# Altium footprint library 常用元件封裝庫(pcb).PCBLIB: 399 footprints (part 13 of 25)
Each footprint in its own frame and in the unit in brackets; x right, y up, seen from the top. Pads: shape width x height; smd on the part's side, far side on the other; paste and mask are expansions set on the pad; w line width, h text height; cw(c..) or ccw(c..) is an arc to the next point about the centre after c.
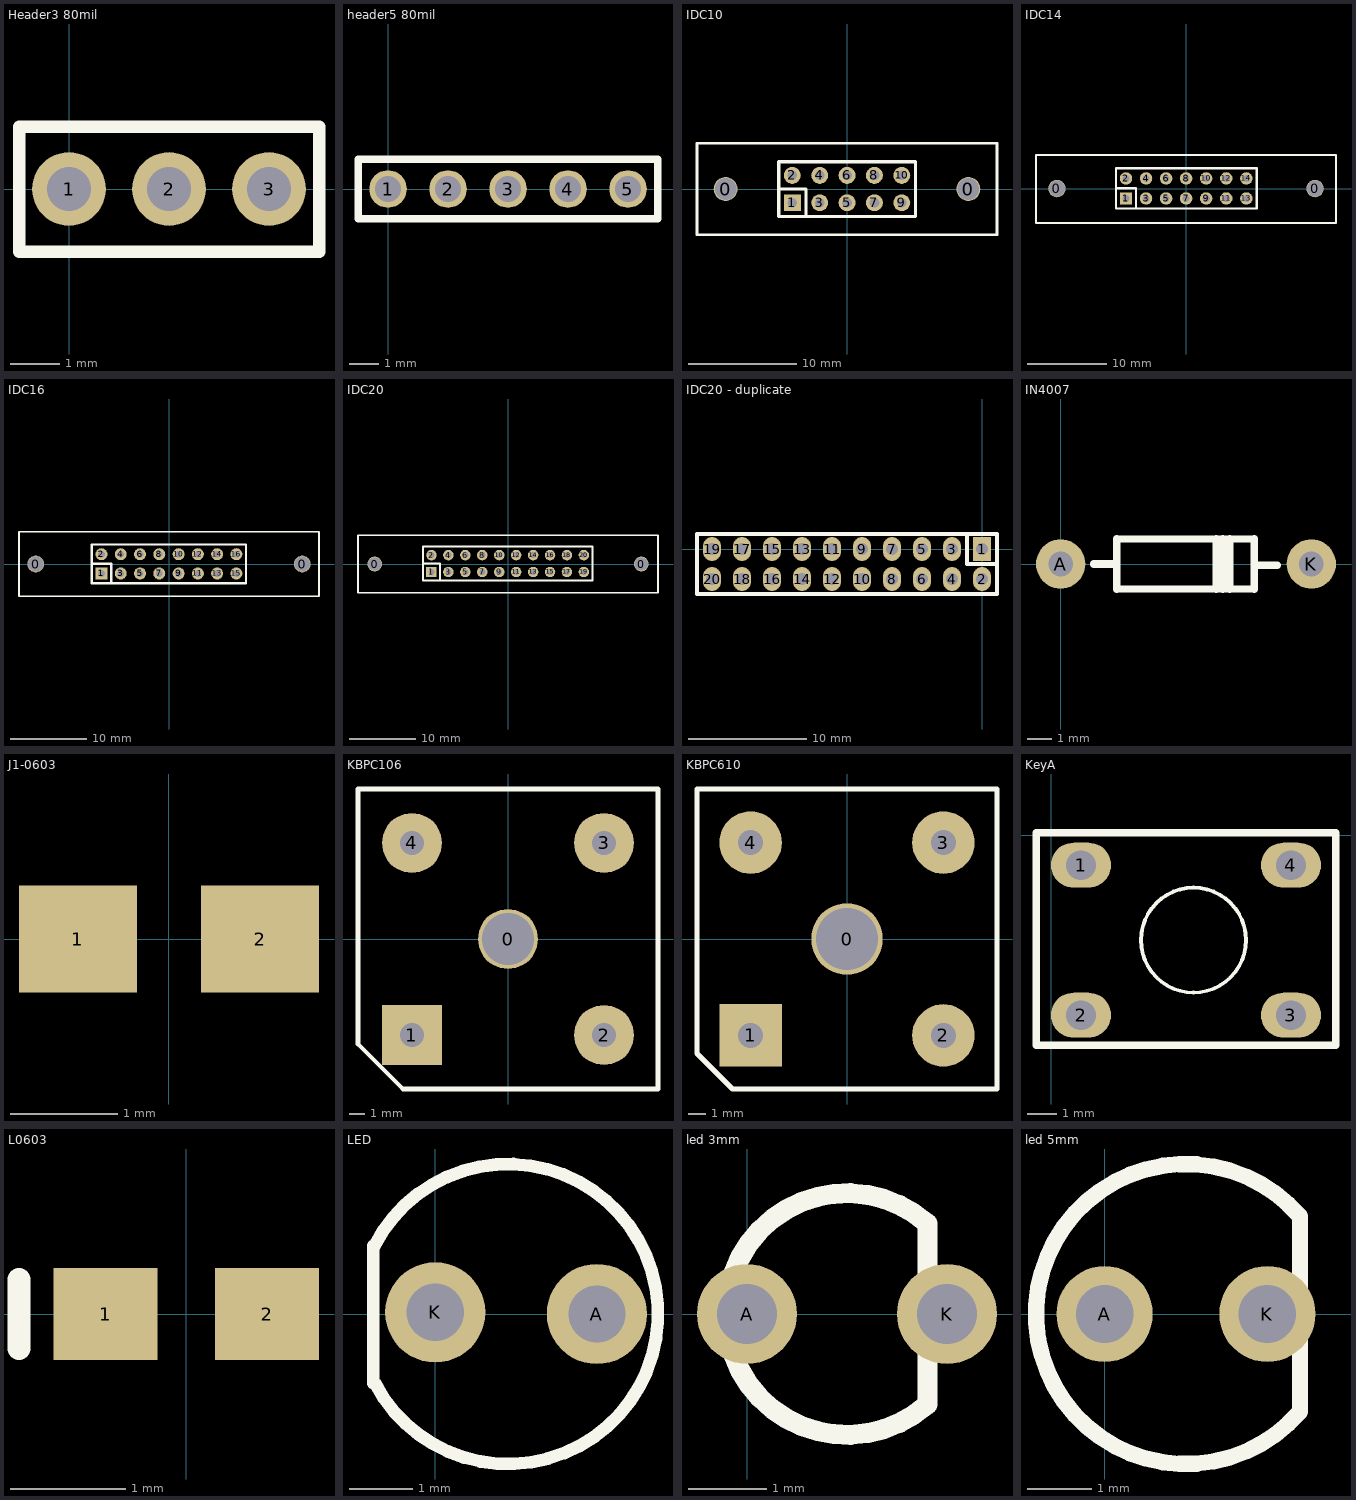
[diagram p12: the footprints below, top view; thin cyan lines are the x and y axes]

## Header3 80mil [mm]
pads (3):
  round 1.5 hole 0.9: 1(0,0) 2(2.032,0) 3(4.064,0)
Top Overlay:
  lines w0.254: -1.016,-1.27 -1.016,1.27 5.08,1.27 5.08,-1.27 -1.016,-1.27

## header5 80mil [mil]
pads (5):
  round 50 hole 35: 1(0,0) 2(80,0) 3(160,0) 4(240,0) 5(320,0)
Top Overlay:
  lines w10: -40,-40 360,-40 360,40 -40,40 -40,-40

## IDC10 [mm]
pads (12):
  round 2.2 hole 2: 0(-11.27,0) 0(11.27,0)
  rect 1.575x1.575 hole 0.9: 1(-5.075,-1.275)
  round 1.575 hole 0.9: 2(-5.075,1.265) 3(-2.535,-1.275) 4(-2.535,1.265) 5(0.005,-1.275) 6(0.005,1.265) 7(2.545,-1.275) 8(2.545,1.265) 9(5.085,-1.275) 10(5.085,1.265)
Top Overlay:
  lines w0.254: -13.92,-4.25 13.92,-4.25 13.92,4.25 -13.92,4.25 -13.92,-4.25
  lines w0.305: -6.345,-0.005 -3.805,-0.005 -3.805,-2.545 ; -6.345,-2.545 -6.345,2.535 6.355,2.535 6.355,-2.545 -6.345,-2.545

## IDC14 [mm]
pads (16):
  round 2.2 hole 2: 0(-16.35,0) 0(16.35,0)
  rect 1.575x1.575 hole 0.9: 1(-7.601,-1.25)
  round 1.575 hole 0.9: 2(-7.601,1.29) 3(-5.061,-1.25) 4(-5.061,1.29) 5(-2.521,-1.25) 6(-2.521,1.29) 7(0.019,-1.25) 8(0.019,1.29) 9(2.559,-1.25) 10(2.559,1.29) 11(5.099,-1.25) 12(5.099,1.29) 13(7.639,-1.25) 14(7.639,1.29)
Top Overlay:
  lines w0.254: -19,-4.35 -19,4.25 19,4.25 19,-4.35 -19,-4.35
  lines w0.305: -8.871,0.02 -6.331,0.02 -6.331,-2.52 ; 8.979,-2.52 8.979,2.56 ; 8.983,-2.515 -8.871,-2.52 -8.871,2.56 8.983,2.57

## IDC16 [mm]
pads (18):
  round 2.2 hole 2: 0(-17.57,0) 0(17.57,0)
  rect 1.575x1.575 hole 0.9: 1(-8.9,-1.25)
  round 1.575 hole 0.9: 2(-8.9,1.29) 3(-6.36,-1.25) 4(-6.36,1.29) 5(-3.82,-1.25) 6(-3.82,1.29) 7(-1.28,-1.25) 8(-1.28,1.29) 9(1.26,-1.25) 10(1.26,1.29) 11(3.8,-1.25) 12(3.8,1.29) 13(6.34,-1.25) 14(6.34,1.29) 15(8.88,-1.25) 16(8.88,1.29)
Top Overlay:
  lines w0.254: 19.765,-4.25 19.765,4.25 ; 19.77,-4.25 -19.77,-4.25 -19.77,4.25 19.77,4.25
  lines w0.305: -10.17,0.02 -7.63,0.02 -7.63,-2.52 ; -10.17,-2.52 -10.17,2.56 10.15,2.56 10.15,-2.52 -10.17,-2.52

## IDC20 [mm]
pads (22):
  round 2.2 hole 2: 0(-20,0) 0(20,0)
  rect 1.575x1.575 hole 0.9: 1(-11.476,-1.2)
  round 1.575 hole 0.9: 2(-11.476,1.34) 3(-8.936,-1.2) 4(-8.936,1.34) 5(-6.396,-1.2) 6(-6.396,1.34) 7(-3.856,-1.2) 8(-3.856,1.34) 9(-1.316,-1.2) 10(-1.316,1.34) 11(1.224,-1.2) 12(1.224,1.34) 13(3.764,-1.2) 14(3.764,1.34) 15(6.304,-1.2) 16(6.304,1.34) 17(8.844,-1.2) 18(8.844,1.34) 19(11.384,-1.2) 20(11.384,1.34)
Top Overlay:
  lines w0.254: -22.5,-4.3 -22.5,4.3 22.5,4.3 22.5,-4.3 -22.5,-4.3
  lines w0.305: -12.746,0.07 -10.206,0.07 -10.206,-2.47 ; -12.746,-2.47 12.654,-2.47 12.654,2.61 -12.746,2.61 -12.746,-2.47

## IDC20 - duplicate [mil]
pads (20):
  rect 60x80 hole 40: 1(0,0)
  oval 60x80 hole 40: 2(0,-100) 3(-100,0) 4(-100,-100) 5(-200,0) 6(-200,-100) 7(-300,0) 8(-300,-100) 9(-400,0) 10(-400,-100) 11(-500,0) 12(-500,-100) 13(-600,0) 14(-600,-100) 15(-700,0) 16(-700,-100) 17(-800,0) 18(-800,-100) 19(-900,0) 20(-900,-100)
Top Overlay:
  lines w12: -50,50 -50,-50 50,-50 ; -950,-150 50,-150 50,50 -950,50 -950,-150

## IN4007 [mm]
pads (2):
  round 2 hole 1: A(0,0) K(10.16,0)
Top Overlay:
  lines w0.305: 1.35,0 2.282,0 ; 2.282,-1.016 2.282,1.016 ; 2.289,-1.007 7.841,-1.014 ; 2.289,1.007 7.841,1.014 ; 6.3,-1.016 6.3,1.016 ; 6.575,-1.016 6.575,1.016 ; 6.85,-1.016 6.85,1.016 ; 7.853,-1.016 7.853,1.016 ; 7.853,-0.05 8.785,-0.05

## J1-0603 [mm] "Chip Resistor; Body 1.6 x 0.8 mm (LxW typ)"
height 0.6
pads (2):
  rect 1.1x1 smd: 1(-0.85,0) 2(0.85,0)

## KBPC106 [mm]
pads (5):
  round 4 hole 3.5: 0(0,0)
  rect 4x4 hole 1.6: 1(-6.4,-6.4)
  round 4 hole 1.6: 2(6.4,-6.4) 3(6.4,6.4) 4(-6.4,6.4)
Top Overlay:
  lines w0.305: -10,-7 -10,10 10,10 10,-10 -7,-10 -10,-7

## KBPC610 [mm]
pads (5):
  round 4 hole 3.5: 0(0,0)
  rect 3.5x3.5 hole 1.4: 1(-5.4,-5.4)
  round 3.5 hole 1.4: 2(5.4,-5.4) 3(5.4,5.4) 4(-5.4,5.4)
Top Overlay:
  lines w0.305: -8.4,-6.4 -6.4,-8.4 8.4,-8.4 8.4,8.4 -8.4,8.4 -8.4,-6.4

## KeyA [mil]
pads (4):
  oval 80x60 hole 39.37: 1(40,-40) 2(40,-240) 3(320,-240) 4(320,-40)
Top Overlay:
  circle w5: c190,-140 r70
  lines w10: -20,-280 140,-280 380,-280 380,-240 380,2.99 371.02,2.99 8.82,2.99 -20,2.99 -20,0 -20,-240 -20,-280

## L0603 [mm] "Chip Inductor; Body 1.6 x 0.8 mm (LxW typ)"
height 0.55
pads (2):
  rect 0.9x0.8 smd: 1(-0.7,0) 2(0.7,0)
Top Overlay:
  lines w0.2: -1.45,-0.3 -1.45,0.3

## LED [mil]
pads (2):
  round 62 hole 35.43: A(100,0) K(0,1)
Top Overlay:
  lines w7.87: -38.34,-42.75 -38.34,42.08 ; -37.62,42.22 cw(c45,0) -37.34,-42.75

## led 3mm [mil]
pads (2):
  round 50 hole 30: A(0,0) K(100,0)
Top Overlay:
  lines w10: 90.14,-45.15 cw(c50,0) 90.14,45.15 90.14,-45.15

## led 5mm [mm]
pads (2):
  round 1.5 hole 0.9: A(0,0) K(2.54,0)
Top Overlay:
  lines w0.254: 3.048,-1.524 cw(c1.27,0) 3.048,1.524 3.048,-1.524